# Altium footprint library AltiumDesignerLibraries.PcbLib: 313 footprints (part 10 of 20)
Each footprint in its own frame and in the unit in brackets; x right, y up, seen from the top. Pads: shape width x height; smd on the part's side, far side on the other; paste and mask are expansions set on the pad; w line width, h text height; cw(c..) or ccw(c..) is an arc to the next point about the centre after c.
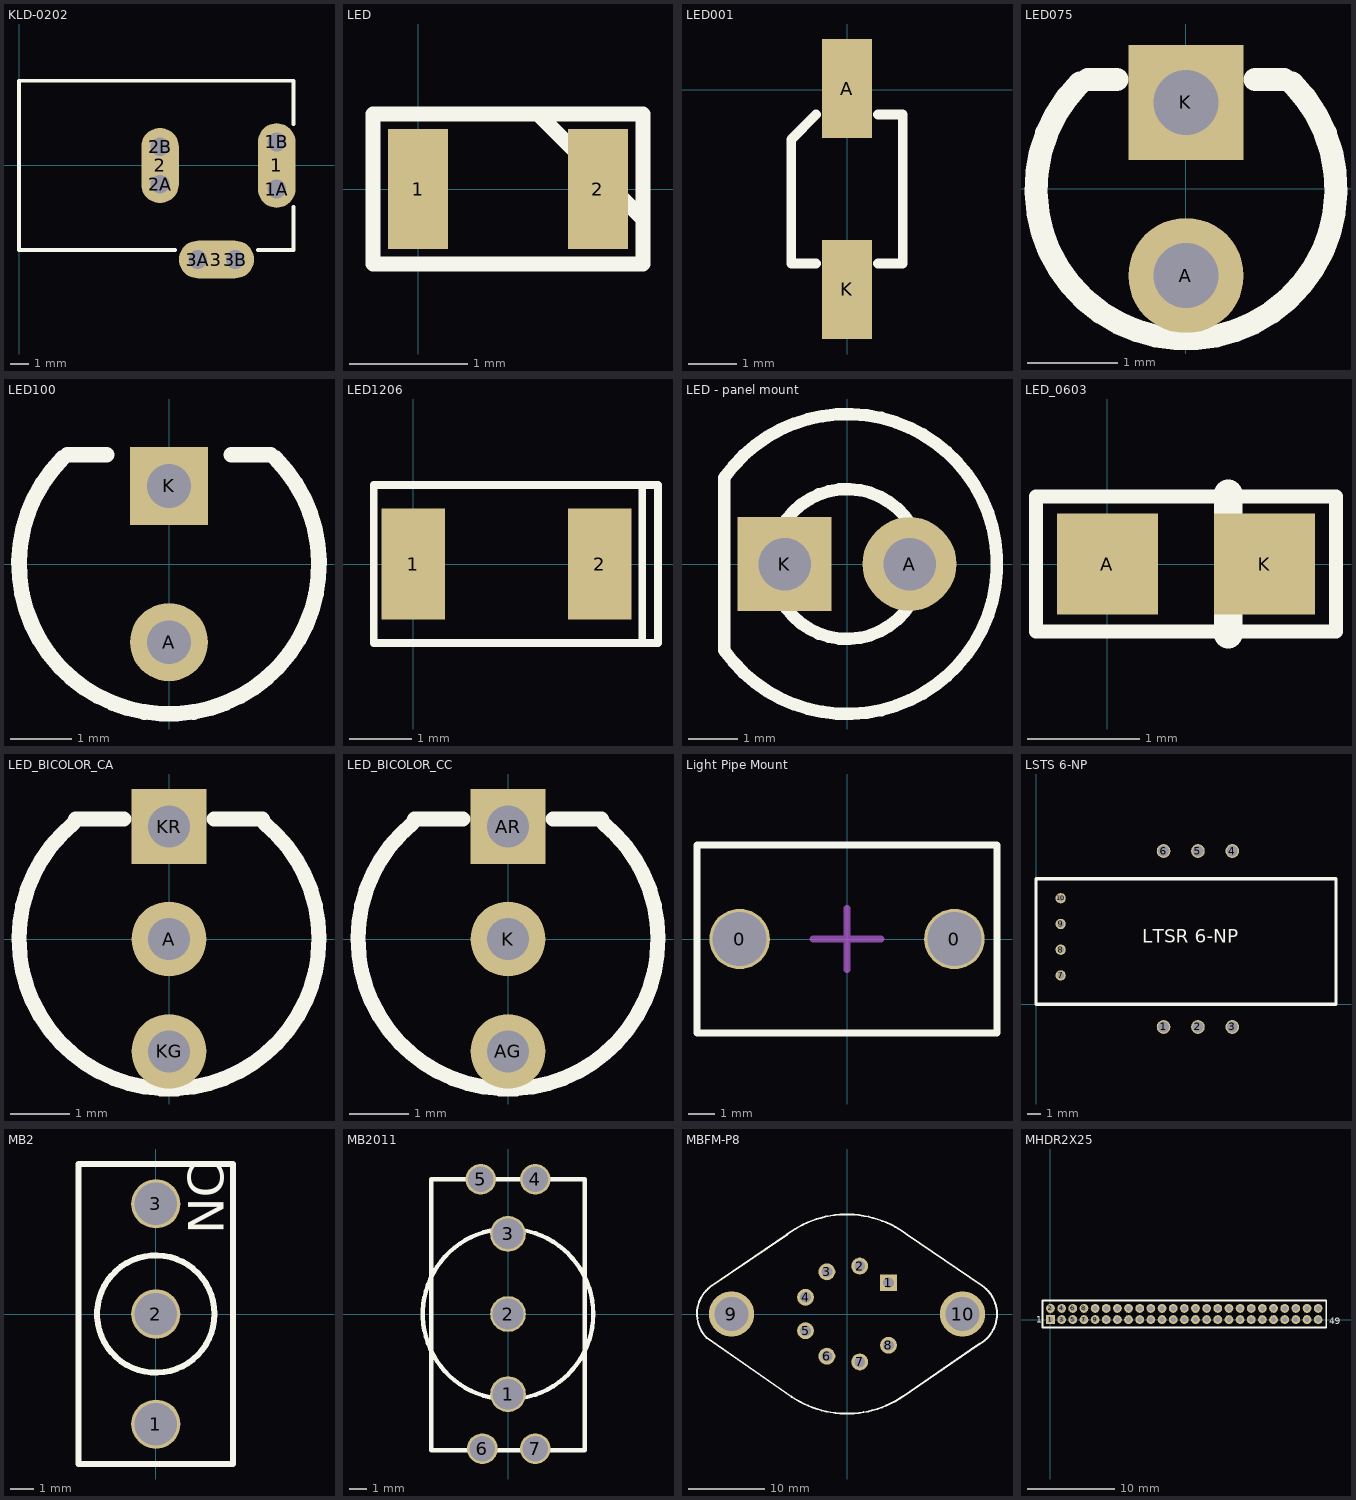
[diagram p9: the footprints below, top view; thin cyan lines are the x and y axes]

## KLD-0202 [mm]
pads (9):
  oval 2x4.5 all layers, no hole: 1(13.7,0)
  round 1.5 hole 1: 1A(13.7,-1.25) 1B(13.7,1.25) 2A(7.5,-1) 2B(7.5,1) 3A(9.5,-5) 3B(11.5,-5)
  oval 2x4 all layers, no hole: 2(7.5,0)
  oval 4x2 all layers, no hole: 3(10.5,-5)
Top Overlay:
  lines w0.2: 8.3,-4.5 0,-4.5 0,4.5 14.6,4.5 14.6,2.2 ; 12.7,-4.5 14.6,-4.5 14.6,-2.2
Mechanical 2:
  lines w1: 7.5,-1 7.5,1 ; 9.5,-5 11.5,-5 ; 13.7,-1.25 13.7,1.25

## LED [mil] "0603"
pads (2):
  rect 20x40 smd: 1(0,0) 2(60,0)
Top Overlay:
  lines w5: 40,25 75,-10 ; -15,-25 75,-25 75,25 -15,25 -15,-25

## LED001 [mil]
pads (2):
  rect 40x80 smd mask+3: A(0,1) K(0,-161)
Top Overlay:
  lines w8: -25,-140 -45,-140 -45,-40 -25,-20 ; 25,-140 45,-140 45,-20 25,-20

## LED075 [mil]
pads (2):
  round 50 hole 28: A(0,-37.5)
  rect 50x50 hole 28: K(0,37.5)
Top Overlay:
  lines w10: -45.96,45.96 ccw(c0,0) 45.96,45.96 ; -42.5,47.5 -30,47.5 ; 30,47.5 42.5,47.5

## LED100 [mil] "5mm LED with 100mil pin spacing"
height 300
pads (2):
  round 50 hole 28: A(0,-50)
  rect 50x50 hole 28: K(0,50)
Top Overlay:
  lines w10: -67.88,67.88 ccw(c0,0) 67.88,67.88 ; -65,70 -40,70 ; 40,70 65,70

## LED1206 [mil]
pads (2):
  rect 40x70 smd: 1(0,0) 2(118.1,0)
Top Overlay:
  lines w5: 145,-50 145,50 ; -25,-50 155,-50 155,50 -25,50 -25,-50

## LED - panel mount [mil]
pads (2):
  round 75 hole 42: A(50,0)
  rect 75x75 hole 42: K(-50,0)
Top Overlay:
  circle w10: c0,0 r60
  lines w10: -98.31,-68.82 ccw(c0,0) -98.31,68.82 -98.31,-68.82

## LED_0603 [mm]
pads (2):
  rect 0.9x0.9 smd: A(0,0) K(1.4,0)
Top Overlay:
  lines w0.127: -0.635,-0.6 -0.635,0.6 2.035,0.6 2.035,-0.6 -0.635,-0.6
  lines w0.254: 1.075,-0.625 1.075,0.625

## LED_BICOLOR_CA [mil]
pads (3):
  round 50 hole 28: A(0,0) KG(0,-75)
  rect 50x50 hole 28: KR(0,75)
Top Overlay:
  lines w10: -64.01,76.83 ccw(c0,0) 64.01,76.83 ; -62.5,80 -30,80 ; 30,80 62.5,80

## LED_BICOLOR_CC [mil]
pads (3):
  round 50 hole 28: AG(0,-75) K(0,0)
  rect 50x50 hole 28: AR(0,75)
Top Overlay:
  lines w10: -64.01,76.83 ccw(c0,0) 64.01,76.83 ; -62.5,80 -30,80 ; 30,80 62.5,80

## Light Pipe Mount [mm] "VCC Light Pipe hardware"
height 8.712
pads (2):
  round 2.25 hole 2.015: 0(-4,0) 0(4,0)
Top Overlay:
  lines w0.254: 2.552,-3.505 5.587,-3.505 5.588,3.505 2.552,3.505 -5.588,3.505 -5.589,-3.505 3.048,-3.505
Mechanical 1:
  lines w0.254: -1.27,0 0,0 ; 0,-1.143 0,0 ; 0,1.143 0,0 ; 1.27,0 0,0

## LSTS 6-NP [mil]
pads (10):
  round 40 hole 31.5: 1(371.77,-65.71) 2(471.77,-65.71) 3(571.77,-65.71) 4(571.77,446.87) 5(471.77,446.87) 6(371.77,446.87)
  round 30 hole 19.68: 7(71.79,84.35) 8(71.79,159.35) 9(71.79,234.35) 10(71.79,309.35)
Top Overlay:
  lines w10: 0,0 0,366.14 874.02,366.14 874.02,0 0,0
  text "LTSR 6-NP" at 310,180 h39.37

## MB2 [mm] "Single-pole PCB mount switch"
pads (3):
  round 2.1 hole 1.8: 1(0,-4.7) 2(0,0) 3(0,4.7)
Top Overlay:
  circle w0.254: c0,0 r2.505
  lines w0.254: -3.3,-6.4 3.3,-6.4 3.3,6.4 -3.3,6.4 -3.3,-6.4
  text "NC" at 2.9,3.4 h1.52
3D body: height 24.43, standoff -5.16, extent -3.302,-6.35 3.302,6.35

## MB2011 [mm] "Single-pole PCB mount switch"
pads (7):
  round 2.1 hole 1.8: 1(0,-4.7) 2(0,0) 3(0,4.7)
  round 1.8 hole 1.5: 4(1.6,7.9) 5(-1.6,7.9) 6(-1.5,-7.9) 7(1.6,-7.9)
Top Overlay:
  circle w0.254: c0,0 r5
  lines w0.254: -4.5,-8 -4.5,7.9 4.5,7.9 4.5,-8 -4.5,-8
3D body: height 37.26, standoff -4.47, extent -5,-8.153 4.988,8.153

## MBFM-P8 [mm]
pads (10):
  rect 2.2x2.2 hole 1.4: 1(5.416,4.082)
  round 2.2 hole 1.4: 2(1.654,6.254) 3(-2.624,5.499) 4(-5.416,2.172) 5(-5.416,-2.172) 6(-2.624,-5.499) 7(1.654,-6.254) 8(5.416,-4.082)
  round 5.9 hole 4.4: 9(-15.075,0) 10(15.075,0)
Top Overlay:
  lines w0.254: -18.322,-3.115 -7.239,-10.803 ; -18.323,-3.115 cw(c-15.075,0) -17.858,3.536 -7.815,10.363 ; -7.842,10.369 cw(c0,0) 7.86,10.355 ; -7.251,-10.79 ccw(c0,0) 7.288,-10.765 ; 7.298,-10.763 17.059,-4.039 ; 7.869,10.323 17.631,3.704 ; 17.062,-4.038 ccw(c15.075,0) 17.63,3.704

## MHDR2X25 [mm]
pads (50):
  rect 1x1 hole 0.6: 1(0,0)
  round 1 hole 0.6: 2(0,1.27) 3(1.27,0) 4(1.27,1.27) 5(2.54,0) 6(2.54,1.27) 7(3.81,0) 8(3.81,1.27) 9(5.08,0) 10(5.08,1.27) 11(6.35,0) 12(6.35,1.27) 13(7.62,0) 14(7.62,1.27) 15(8.89,0) 16(8.89,1.27) 17(10.16,0) 18(10.16,1.27) 19(11.43,0) 20(11.43,1.27) 21(12.7,0) 22(12.7,1.27) 23(13.97,0) 24(13.97,1.27) 25(15.24,0) 26(15.24,1.27) 27(16.51,0) 28(16.51,1.27) 29(17.78,0) 30(17.78,1.27) 31(19.05,0) 32(19.05,1.27) 33(20.32,0) 34(20.32,1.27) 35(21.59,0) 36(21.59,1.27) 37(22.86,0) 38(22.86,1.27) 39(24.13,0) 40(24.13,1.27) 41(25.4,0) 42(25.4,1.27) 43(26.67,0) 44(26.67,1.27) 45(27.94,0) 46(27.94,1.27) 47(29.21,0) 48(29.21,1.27) 49(30.48,0) 50(30.48,1.27)
Top Overlay:
  lines w0.2: -0.9,-0.9 31.394,-0.9 31.394,2.17 -0.9,2.17 -0.9,-0.9
  text "1" at -1.651,-0.381 h0.76
  text "49" at 31.75,-0.508 h0.76